# Altium footprint library HidroanaPCBLib1.PcbLib: 88 footprints (part 5 of 6)
Each footprint in its own frame and in the unit in brackets; x right, y up, seen from the top. Pads: shape width x height; smd on the part's side, far side on the other; paste and mask are expansions set on the pad; w line width, h text height; cw(c..) or ccw(c..) is an arc to the next point about the centre after c.
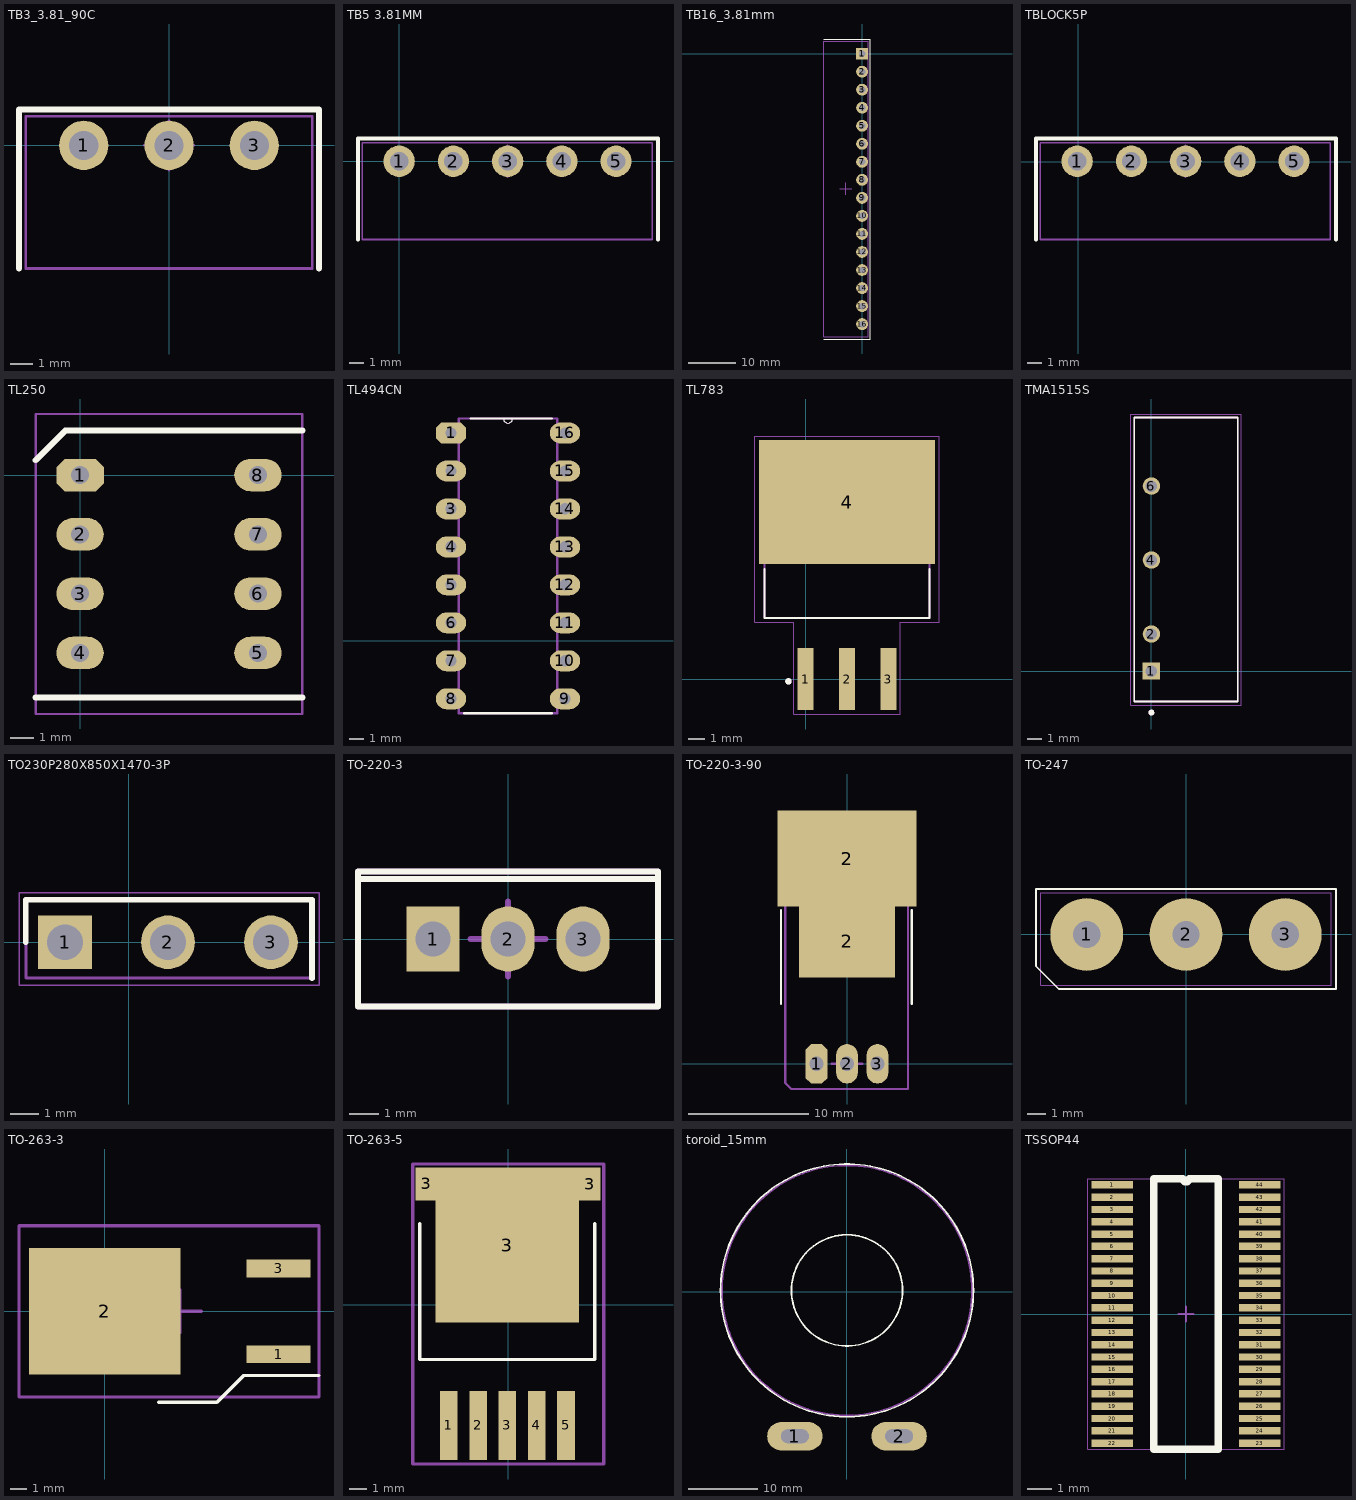
[diagram p4: the footprints below, top view; thin cyan lines are the x and y axes]

## TB3_3.81_90C [mm]
pads (3):
  round 2.2 hole 1.3 mask+0.05: 1(-3.81,0) 2(0,0) 3(3.81,0)
Top Overlay:
  lines w0.254: -6.705,-5.5 -6.705,1.5 ; -6.705,1.6 6.7,1.6 6.7,-5.5
Top Component Center:
  lines w0.124: -1.1,0 1.1,0 ; 0,-1.1 0,1.1 ; -6.405,-5.5 6.4,-5.5 6.4,1.3 -6.405,1.3 -6.405,-5.5
Top Designator:
  text ".Designator" at -5.339,-2.745 h1.52
3D body "User Library-15EDG[K-RC]-3_81-03 (combin).STEP": height 7.37, standoff -3.63, extent -6.11,-17.15 6.11,1.2

## TB5 3.81MM [mm]
height 11
pads (5):
  round 2.2 hole 1.3 mask+0.05: 1(0,0) 2(3.81,0) 3(7.62,0) 4(11.43,0) 5(15.24,0)
Top Overlay:
  lines w0.254: -2.895,-5.5 -2.895,1.6 18.188,1.6 18.188,-5.5
Top Component Center:
  lines w0.124: 6.52,0 8.72,0 ; 7.62,-1.1 7.62,1.1 ; -2.595,-5.5 -2.595,1.3 17.78,1.3 17.78,-5.5 -2.595,-5.5
Top Designator:
  text ".Designator" at 5.368,-2.766 h1
3D body "691322310005.stp": height 7.27, standoff -3.43, extent -2.528,-7.944 17.712,1.256

## TB16_3.81mm [mm]
pads (16):
  rect 2.5x2.5 hole 1.35 mask+0.05: 1(0,0)
  round 2.5 hole 1.35 mask+0.05: 2(0,-3.81) 3(0,-7.62) 4(0,-11.43) 5(0,-15.24) 6(0,-19.05) 7(0,-22.86) 8(0,-26.67) 9(0,-30.48) 10(0,-34.29) 11(0,-38.1) 12(0,-41.91) 13(0,-45.72) 14(0,-49.53) 15(0,-53.34) 16(0,-57.15)
Top Overlay:
  lines w0.254: -8.1,3.1 1.76,3.1 1.76,-60.3 -8.06,-60.3
Top Component Center:
  lines w0.254: -4.699,-28.575 -2.159,-28.575 ; -3.429,-29.845 -3.429,-27.305 ; -8.128,-59.817 1.27,-59.817 1.27,2.667 -8.128,2.667 -8.128,-59.817
Top Designator:
  text ".Designator" at -2.191,-31.75 h1.52
3D body "16P_3.81mm_395121016.stp": height 6.86, standoff -3.56, extent -8.128,-59.753 1.016,2.604

## TBLOCK5P [mm]
pads (5):
  round 2.2 hole 1.3 mask+0.05: 1(-0.067,0.021) 2(3.743,0.021) 3(7.553,0.021) 4(11.363,0.021) 5(15.173,0.021)
Top Overlay:
  lines w0.254: -2.962,-5.479 -2.962,1.621 18.121,1.621 18.121,-5.479
Top Component Center:
  lines w0.124: 6.453,0.021 8.653,0.021 ; 7.553,-1.079 7.553,1.121 ; -2.662,-5.479 17.713,-5.479 17.713,1.321 -2.662,1.321 -2.662,-5.479
Top Designator:
  text ".Designator" at 5.301,-2.745 h1
3D body "691322310005.stp": height 7.27, standoff -3.43, extent -2.595,-7.923 17.645,1.277

## TL250 [mil]
pads (8):
  oct 80x55 hole 30: 1(0,0)
  oval 80x55 hole 30: 2(0,-100) 3(0,-200) 4(0,-300) 5(300,-300) 6(300,-200) 7(300,-100) 8(300,0)
Top Overlay:
  lines w10: -75,-375 375,-375 ; -75,25 -25,75 0,75 375,75
Top Component Center:
  lines w3.94: -75,-403.03 -75,103.03 375,103.03 375,-403.03 -75,-403.03
Top Designator:
  text ".Designator" at -149.9,-169.99 h60
3D body "DIP8.step": height 165, standoff -105, extent -4.99,-374.99 305,75

## TL494CN [mil]
pads (16):
  oct 80x55 hole 30: 1(-688,547)
  oval 80x55 hole 30: 2(-688,447) 3(-688,347) 4(-688,247) 5(-688,147) 6(-688,47) 7(-688,-53) 8(-688,-153) 9(-388,-153) 10(-388,-53) 11(-388,47) 12(-388,147) 13(-388,247) 14(-388,347) 15(-388,447) 16(-388,547)
Top Overlay:
  lines w0: -550,585 ccw(c-538,585) -526,585
  lines w6: -653,-191 -423,-191 ; -636,585 -550,585 -526,585 -423,585
Top Component Center:
  lines w0: -550,585 ccw(c-538,585) -526,585
  lines w6: -710,-175 -668,-175 -668,-131 -710,-131 -710,-175 ; -710,-75 -668,-75 -668,-31 -710,-31 -710,-75 ; -710,25 -668,25 -668,69 -710,69 -710,25 ; -710,125 -668,125 -668,169 -710,169 -710,125 ; -710,225 -668,225 -668,269 -710,269 -710,225 ; -710,325 -668,325 -668,369 -710,369 -710,325 ; -710,425 -710,469 -668,469 -668,425 -710,425 ; -710,525 -710,569 -668,569 -668,525 -710,525 ; -668,-191 -408,-191 -408,585 -526,585 -550,585 -668,585 -668,-191 ; -408,-175 -366,-175 -366,-131 -408,-131 -408,-175 ; -408,-75 -366,-75 -366,-31 -408,-31 -408,-75 ; -408,25 -366,25 -366,69 -408,69 -408,25 ; -408,125 -366,125 -366,169 -408,169 -408,125 ; -408,225 -366,225 -366,269 -408,269 -408,225 ; -408,325 -366,325 -366,369 -408,369 -408,325 ; -408,425 -408,469 -366,469 -366,425 -408,425 ; -408,525 -408,569 -366,569 -366,525 -408,525
Top Designator:
  text ".Designator" at -839.9,190.01 h60
3D body "DIP 16 IC.step": height 200.79, standoff -129.92, extent -692.92,-188.69 -383.07,598.71

## TL783 [mm]
pads (4):
  rect 0.99x3.79 smd: 1(0,0) 2(2.54,0) 3(5.08,0)
  rect 10.84x7.62 smd paste-6: 4(2.54,10.88)
Top Overlay:
  circle w0.2: c-1.06,-0.145 r0.1
  lines w0.127: -2.54,6.757 -2.54,3.752 7.62,3.752 7.62,6.757
Top Paste:
  region: 2.27,11.605 2.27,10.155 1.01,10.155 1.01,11.605
  region: 2.27,14.145 2.27,12.695 1.01,12.695 1.01,14.145
  region: 2.27,9.065 2.27,7.615 1.01,7.615 1.01,9.065
  region: 0.47,11.605 0.47,10.155 -0.79,10.155 -0.79,11.605
  region: 0.47,14.145 0.47,12.695 -0.79,12.695 -0.79,14.145
  region: 0.47,9.065 0.47,7.615 -0.79,7.615 -0.79,9.065
  region: -1.33,11.605 -1.33,10.155 -2.59,10.155 -2.59,11.605
  region: -1.33,14.145 -1.33,12.695 -2.59,12.695 -2.59,14.145
  region: -1.33,9.065 -1.33,7.615 -2.59,7.615 -2.59,9.065
  region: 4.07,11.605 4.07,10.155 2.81,10.155 2.81,11.605
  region: 4.07,14.145 4.07,12.695 2.81,12.695 2.81,14.145
  region: 4.07,9.065 4.07,7.615 2.81,7.615 2.81,9.065
  region: 5.87,11.605 5.87,10.155 4.61,10.155 4.61,11.605
  region: 5.87,14.145 5.87,12.695 4.61,12.695 4.61,14.145
  region: 5.87,9.065 5.87,7.615 4.61,7.615 4.61,9.065
  region: 7.67,11.605 7.67,10.155 6.41,10.155 6.41,11.605
  region: 7.67,14.145 7.67,12.695 6.41,12.695 6.41,14.145
  region: 7.67,9.065 7.67,7.615 6.41,7.615 6.41,9.065
Top Designator:
  text ".Designator" at -5.062,7.795 h1.52
asdasdasdasdasd:
  circle w0.2: c-1.06,-0.145 r0.1
  lines w0.127: -2.54,3.752 -2.54,12.773 7.62,12.773 7.62,3.752 -2.54,3.752
asd:
  lines w0.05: -3.13,3.502 -3.13,14.94 8.21,14.94 8.21,3.502 5.83,3.502 5.83,-2.15 -0.75,-2.15 -0.75,3.502 -3.13,3.502
3D body "TL783CKTTR.step": height 4.83, standoff -0.25, extent -2.54,-0.711 7.62,14.529

## TMA1515S [mm]
pads (4):
  rect 1.19x1.19 / inner round 1.19 / far side rect 1.19x1.19 hole 0.79: 1(0,0)
  round 1.19 hole 0.79: 2(0,2.54) 4(0,7.62) 6(0,12.7)
Top Overlay:
  circle w0.2: c0,-2.85 r0.1
  lines w0.127: -1.173,-2.1 5.927,-2.1 5.927,17.4 -1.173,17.4 -1.173,-2.1
asdasdasdasdasd:
  circle w0.2: c0,-2.85 r0.1
  lines w0.127: -1.173,-2.1 5.927,-2.1 5.927,17.4 -1.173,17.4 -1.173,-2.1
asd:
  lines w0.05: -1.423,-2.35 6.177,-2.35 6.177,17.65 -1.423,17.65 -1.423,-2.35
3D body "TMA_1515S.stp": height 9.7, standoff -3.7, extent -1.01,-2.13 6.09,17.37

## TO230P280X850X1470-3P [mm]
pads (3):
  rect 1.92x1.92 hole 1.28: 1(-2.286,0)
  round 1.92 hole 1.28: 2(1.397,0) 3(5.08,0)
Top Overlay:
  lines w0.2: -3.683,0 -3.683,1.515 6.55,1.515 6.55,-1.285
Top Component Center:
  lines w0.05: -3.932,-1.535 6.8,-1.535 6.8,1.765 -3.932,1.765 -3.932,-1.535
  lines w0.1: -3.556,1.515 -1.375,1.515 -0.8,1.515 ; -3.683,-1.285 6.55,-1.285 6.55,1.515 -1.95,1.515 -3.683,1.515 -3.683,0.948 -3.683,0.381 -3.683,-0.918 -3.683,-1.285
Top Designator:
  text ".Designator" at -6.221,-0.508 h1.52
3D body "2SD882-AZ.stp": height 14.5, standoff -24, extent -2.785,-1.273 5.715,1.527

## TO-220-3 [mm]
pads (3):
  rect 1.8x2.2 hole 1.2: 1(-2.54,0)
  oval 1.8x2.2 hole 1.2: 2(0,0) 3(2.54,0)
Top Overlay:
  lines w0.2: -5.08,2.032 5.08,2.032 ; -5.08,-2.286 -5.08,2.286 5.08,2.286 5.08,-2.286 -5.08,-2.286
Top Component Center:
  lines w0.2: -1.27,0 1.27,0 ; 0,-1.27 0,1.27 ; -5.08,-2.286 -5.08,2.286 5.08,2.286 5.08,-2.286 -5.08,-2.286
Top Designator:
  text ".Designator" at -7.618,-0.508 h1.52
3D body "User Library-TO-220-1.step": height 20.8, standoff -7.98, extent -4.973,-2.156 4.927,2.344

## TO-220-3-90 [mm]
pads (5):
  oct 1.8x3.3 hole 1.2: 1(-2.54,0)
  oval 1.8x3.3 hole 1.2: 2(0,0) 3(2.54,0)
  rect 8x6 smd: 2(0,10.2)
  rect 11.6x8 smd: 2(0,17.1)
Top Overlay:
  lines w0.2: -5.5,5 -5.5,12.8 ; 5.4,5 5.4,12.8
Top Component Center:
  lines w0.2: -1.27,0 1.27,0 ; 0,-1.27 0,1.27 ; -5.14,-1.6 -5.14,20.2 5.08,20.2 5.08,-2.1 -4.64,-2.1 -5.14,-1.6
Top Designator:
  text ".Designator" at -7.458,8.392 h1.52
3D body "TO-220_correct_angle.STEP": height 4.51, standoff -2.26, extent -5.01,-0.25 5.01,20

## TO-247 [mm]
pads (3):
  round 4 hole 1.5: 1(-5.46,0) 2(0,0) 3(5.46,0)
Top Overlay:
  lines w0.1: -8.25,-1.75 -8.25,2.5 8.25,2.5 8.25,-3 -7,-3 -8.25,-1.75
Top Component Center:
  lines w0.05: -8,-2.8 8,-2.8 8,2.3 -8,2.3 -8,-2.8
  lines w0.1: -0.5,0 0.5,0 ; 0,-0.5 0,0.5
Top Designator:
  text ".Designator" at -2.252,-0.226 h1
3D body "TO247-3-21.step": height 27.95, standoff -13.18, extent -7.95,-2.8 7.95,2.3

## TO-263-3 [mm]
pads (3):
  rrect3% 3.82x1.05 smd mask+0.15: 1(10.3,-2.54) 3(10.3,2.54)
  rrect1% 9x7.48 smd mask+0.15: 2(0,0)
Top Overlay:
  lines w0.2: 3.187,-5.399 6.656,-5.399 8.25,-3.805 12.695,-3.805
Top Component Center:
  lines w0.2: -0.635,0 0.635,0 ; 0,0.635 0,-0.635 ; 0,-0.635 0,0 0,-0.635
Bottom Component Center:
  lines w0.2: 3.175,0 5.715,0 ; 4.445,-1.27 4.445,1.27 ; -5.08,-5.08 -5.08,5.08 12.7,5.08 12.7,-5.08 -5.08,-5.08
Top Designator:
  text ".Designator" at 0.984,-3.175 h1.52
3D body "TO-263-3.step": height 4.78, standoff -0.23, extent -3.822,-5.08 11.442,5.08

## TO-263-5 [mm]
pads (8):
  rect 1.02x4 smd: 1(-3.436,-7.005) 2(-1.736,-7.005) 3(-0.036,-7.005) 4(1.664,-7.005) 5(3.364,-7.005)
  rect 1.235x1.91 smd: 3(-4.735,7.005) 3(4.735,6.993)
  rect 8.33x9 smd: 3(-0.036,3.456)
Top Overlay:
  lines w0.2: -5.116,4.7 -5.116,-3.184 5.044,-3.184 5.044,4.7
Top Component Center:
  lines w0.2: -5.536,-9.244 5.564,-9.244 5.564,8.156 -5.536,8.156 -5.536,-9.244
Top Designator:
  text ".Designator" at -7.618,-0.508 h1.52
3D body "LM2596S-12.stp": height 4.72, standoff 0, extent -5.116,-7.784 5.044,6.566

## toroid_15mm [mm]
pads (2):
  oval 8x4.1 hole 2 slot 4 at 0 deg unplated: 1(-7.5,-20.828)
  oval 8x4.1 hole 2 slot 4 at 0 deg: 2(7.5,-20.828)
Top Overlay:
  circle w0.254: c0,0.172 r8
  circle w0.254: c0,0.172 r18.2
Top Component Center:
  circle w0.254: c0,0.172 r18
Top Designator:
  text ".Designator" at -7.618,-0.508 h1.52

## TSSOP44 [mm]
pads (44):
  rect 1.7x0.3 smd mask+0.127: 1(-3,5.25) 2(-3,4.75) 3(-3,4.25) 4(-3,3.75) 5(-3,3.25) 6(-3,2.75) 7(-3,2.25) 8(-3,1.75) 9(-3,1.25) 10(-3,0.75) 11(-3,0.25) 12(-3,-0.25) 13(-3,-0.75) 14(-3,-1.25) 15(-3,-1.75) 16(-3,-2.25) 17(-3,-2.75) 18(-3,-3.25) 19(-3,-3.75) 20(-3,-4.25) 21(-3,-4.75) 22(-3,-5.25) 23(3,-5.25) 24(3,-4.75) 25(3,-4.25) 26(3,-3.75) 27(3,-3.25) 28(3,-2.75) 29(3,-2.25) 30(3,-1.75) 31(3,-1.25) 32(3,-0.75) 33(3,-0.25) 34(3,0.25) 35(3,0.75) 36(3,1.25) 37(3,1.75) 38(3,2.25) 39(3,2.75) 40(3,3.25) 41(3,3.75) 42(3,4.25) 43(3,4.75) 44(3,5.25)
Top Overlay:
  lines w0.3: -1.315,-5.5 -1.315,5.5 ; -1.215,-5.5 1.215,-5.5 ; -1.215,5.5 -0.125,5.5 ccw(c0,5.5) 0.125,5.5 1.215,5.5 ; 1.315,-5.5 1.315,5.5
Top Component Center:
  lines w0.05: -4,-5.5 4,-5.5 4,5.5 -4,5.5 -4,-5.5
  lines w0.1: -0.3,0 0.3,0 ; 0,-0.3 0,0.3
Top Designator:
  text ".Designator" at -2.859,-0.287 h1.27
3D body "BQ7694006DBT.stp": height 1.13, standoff 0, extent -3.2,-5.5 3.2,5.5